# Altium footprint library UP-ROBOT Connectors(2013-02-26).PcbLib: 121 footprints (part 2 of 8)
Each footprint in its own frame and in the unit in brackets; x right, y up, seen from the top. Pads: shape width x height; smd on the part's side, far side on the other; paste and mask are expansions set on the pad; w line width, h text height; cw(c..) or ccw(c..) is an arc to the next point about the centre after c.
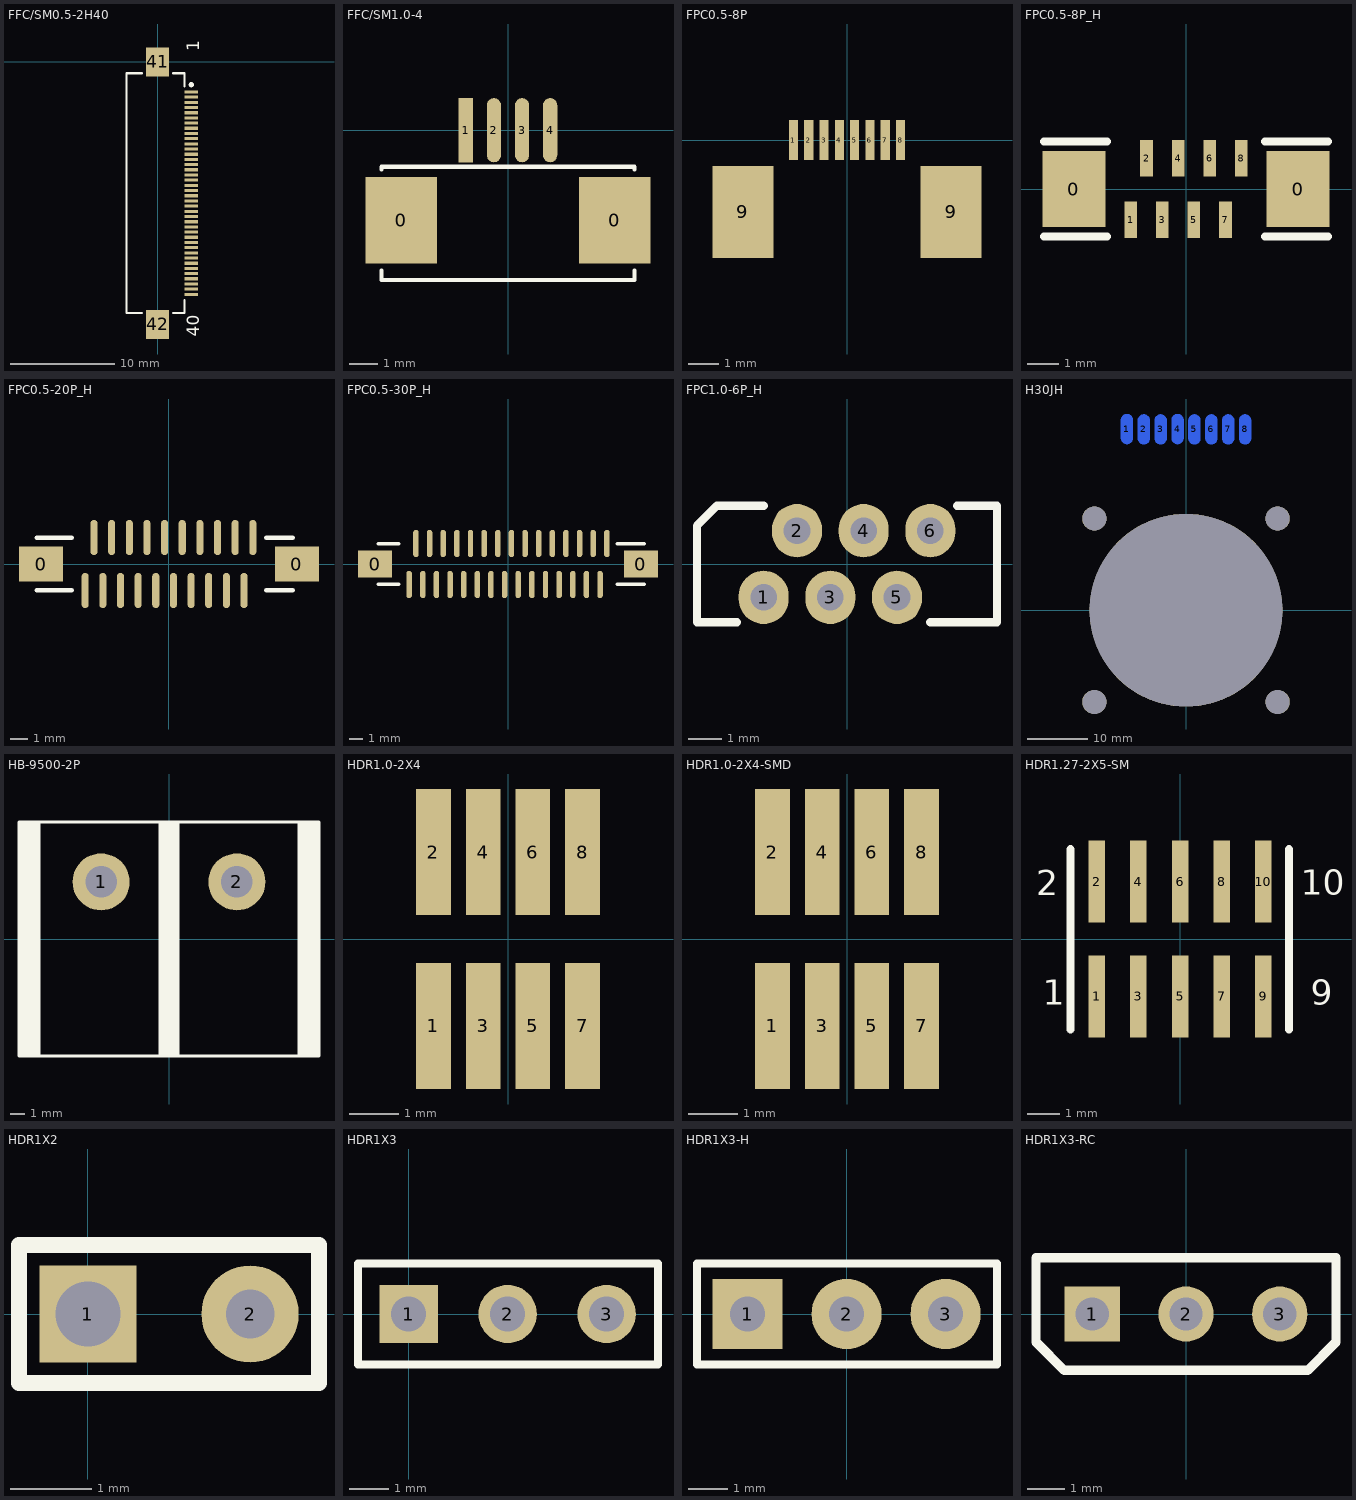
[diagram p1: the footprints below, top view; thin cyan lines are the x and y axes]

## FFC/SM0.5-2H40 [mm]
pads (42):
  rect 1.3x0.3 smd: 1(3.25,-2.9) 2(3.25,-3.4) 3(3.25,-3.9) 4(3.25,-4.4) 5(3.25,-4.9) 6(3.25,-5.4) 7(3.25,-5.9) 8(3.25,-6.4) 9(3.25,-6.9) 10(3.25,-7.4) 11(3.25,-7.9) 12(3.25,-8.4) 13(3.25,-8.9) 14(3.25,-9.4) 15(3.25,-9.9) 16(3.25,-10.4) 17(3.25,-10.9) 18(3.25,-11.4) 19(3.25,-11.9) 20(3.25,-12.4) 21(3.25,-12.9) 22(3.25,-13.4) 23(3.25,-13.9) 24(3.25,-14.4) 25(3.25,-14.9) 26(3.25,-15.4) 27(3.25,-15.9) 28(3.25,-16.4) 29(3.25,-16.9) 30(3.25,-17.4) 31(3.25,-17.9) 32(3.25,-18.4) 33(3.25,-18.9) 34(3.25,-19.4) 35(3.25,-19.9) 36(3.25,-20.4) 37(3.25,-20.9) 38(3.25,-21.4) 39(3.25,-21.9) 40(3.25,-22.4)
  rect 2.2x2.8 smd: 41(0,0) 42(0,-25.3)
Top Overlay:
  circle w0.25: c3.25,-2.2 r0.125
  lines w0.2: -1.5,-24.2 -3,-24.2 -3,-1.1 -1.5,-1.1 ; 1.5,-24.2 2.6,-24.2 2.6,-22.95 ; 1.5,-1.1 2.6,-1.1 2.6,-2.35
  text "1" at 4,1 h1.2
  text "40" at 4,-26.5 h1.2

## FFC/SM1.0-4 [mm]
pads (6):
  rect 2.54x3.08 smd: 0(-3.8,-3.2) 0(3.8,-3.2)
  rect 0.508x2.286 smd: 1(-1.5,0)
  oval 0.508x2.286 smd: 2(-0.5,0) 3(0.5,0) 4(1.5,0)
Top Overlay:
  lines w0.15: -4.5,-5.33 4.5,-5.33 ; -4.5,-5.3 -4.5,-5 ; -4.5,-1.4 -4.5,-1.3 0.054,-1.3 4.5,-1.3 4.5,-1.4 ; 4.5,-5.3 4.5,-5

## FPC0.5-8P [mm]
pads (10):
  rect 0.3x1.3 smd: 1(-1.75,0) 2(-1.25,0) 3(-0.75,0) 4(-0.25,0) 5(0.25,0) 6(0.75,0) 7(1.25,0) 8(1.75,0)
  rect 2x3 smd: 9(-3.4,-2.35) 9(3.4,-2.35)
3D body: height 1.2, standoff 0, extent -4.452,-3.905 4.448,-0.455

## FPC0.5-8P_H [mm]
pads (10):
  rect 2x2.4 smd: 0(-3.55,0) 0(3.55,0)
  rect 0.4x1.15 smd: 1(-1.75,-0.975) 2(-1.25,0.975) 3(-0.75,-0.975) 4(-0.25,0.975) 5(0.25,-0.975) 6(0.75,0.975) 7(1.25,-0.975) 8(1.75,0.975)
Top Overlay:
  lines w0.254: -4.5,-1.5 -2.5,-1.5 ; -4.5,1.5 -2.5,1.5 ; 2.5,-1.5 4.5,-1.5 ; 2.5,1.5 4.5,1.5
3D body: height 4.15, standoff 0, extent -4.25,-1.7 4.25,1.75

## FPC0.5-20P_H [mm]
pads (22):
  rect 2.5x2 smd: 0(-7.25,0) 0(7.25,0)
  oval 0.4x2 smd: 1(-4.75,-1.5) 2(-4.25,1.5) 3(-3.75,-1.5) 4(-3.25,1.5) 5(-2.75,-1.5) 6(-2.25,1.5) 7(-1.75,-1.5) 8(-1.25,1.5) 9(-0.75,-1.5) 10(-0.25,1.5) 11(0.25,-1.5) 12(0.75,1.5) 13(1.25,-1.5) 14(1.75,1.5) 15(2.25,-1.5) 16(2.75,1.5) 17(3.25,-1.5) 18(3.75,1.5) 19(4.25,-1.5) 20(4.75,1.5)
Top Overlay:
  lines w0.254: -7.5,-1.5 -5.5,-1.5 ; -7.5,1.5 -5.5,1.5 ; 5.5,-1.5 7,-1.5 ; 5.5,1.5 7,1.5
3D body: height 5.3, standoff 0, extent -7.86,-1.65 7.84,1.85

## FPC0.5-30P_H [mm]
pads (32):
  rect 2.5x2 smd: 0(-9.75,0) 0(9.75,0)
  oval 0.4x2 smd: 1(7.25,1.5) 2(6.75,-1.5) 3(6.25,1.5) 4(5.75,-1.5) 5(5.25,1.5) 6(4.75,-1.5) 7(4.25,1.5) 8(3.75,-1.5) 9(3.25,1.5) 10(2.75,-1.5) 11(2.25,1.5) 12(1.75,-1.5) 13(1.25,1.5) 14(0.75,-1.5) 15(0.25,1.5) 16(-0.25,-1.5) 17(-0.75,1.5) 18(-1.25,-1.5) 19(-1.75,1.5) 20(-2.25,-1.5) 21(-2.75,1.5) 22(-3.25,-1.5) 23(-3.75,1.5) 24(-4.25,-1.5) 25(-4.75,1.5) 26(-5.25,-1.5) 27(-5.75,1.5) 28(-6.25,-1.5) 29(-6.75,1.5) 30(-7.25,-1.5)
Top Overlay:
  lines w0.254: -9.5,-1.5 -8,-1.5 ; -9.5,1.5 -8,1.5 ; 8,-1.5 10,-1.5 ; 8,1.5 10,1.5

## FPC1.0-6P_H [mm]
pads (6):
  oval 1.5x1.6 hole 0.8: 1(-2.5,-1) 2(-1.5,1) 3(-0.5,-1) 4(0.5,1) 5(1.5,-1) 6(2.5,1)
Top Overlay:
  lines w0.254: -3.3,-1.75 -4.5,-1.75 -4.5,1.15 -3.9,1.75 -2.5,1.75 ; 2.5,-1.75 4.5,-1.75 4.5,1.75 3.3,1.75

## H30JH [mm]
pads (13):
  oval 2x5 smd far side: 1(-9.8,30.05) 2(-7,30) 3(-4.2,30) 4(-1.4,30.05) 5(1.4,30) 6(4.2,30) 7(7,30) 8(9.8,30)
  round 4 hole 4: ""(-15.205,-15.205) ""(-15.205,15.205) ""(15.205,-15.205) ""(15.205,15.205)
  round 32 hole 32: ""(0,0)
3D body: height 18, standoff -34, extent -26,-25.987 25.993,26.007

## HB-9500-2P [mm]
pads (2):
  round 4 hole 2.2: 1(-4.75,4) 2(4.75,4)
Top Overlay:
  rectangle: -0.75,-8.2 0.75,8.2
  rectangle: 9,-8.2 10.5,8.2
  region: -9,8.2 -10.5,8.2 -10.5,-8.2 -9,-8.2
  lines w0.2: -10.5,-8.2 10.5,-8.2 10.5,8.2 -10.5,8.2 -10.5,-8.2
3D body: height 3.5, standoff -17, extent -10.3,-8 10.3,8

## HDR1.0-2X4 [mm]
pads (8):
  rect 0.7x2.54 smd: 1(-1.5,-1.75) 2(-1.5,1.75) 3(-0.5,-1.75) 4(-0.5,1.75) 5(0.5,-1.75) 6(0.5,1.75) 7(1.5,-1.75) 8(1.5,1.75)
3D body: height 3.7, standoff -0.01, extent -1.99,-2.56 2.01,2.64

## HDR1.0-2X4-SMD [mm]
pads (8):
  rect 0.7x2.54 smd: 1(-1.5,-1.75) 2(-1.5,1.75) 3(-0.5,-1.75) 4(-0.5,1.75) 5(0.5,-1.75) 6(0.5,1.75) 7(1.5,-1.75) 8(1.5,1.75)
3D body: height 3.7, standoff -0.01, extent -1.99,-2.56 2.01,2.64

## HDR1.27-2X5-SM [mm]
pads (10):
  rect 0.5x2.5 smd: 1(-2.54,-1.75) 2(-2.54,1.75) 3(-1.27,-1.75) 4(-1.27,1.75) 5(0,-1.75) 6(0,1.75) 7(1.27,-1.75) 8(1.27,1.75) 9(2.54,-1.75) 10(2.54,1.75)
Top Overlay:
  lines w0.254: -3.34,-2.76 -3.34,2.74 ; 3.32,-2.76 3.32,2.74
  text "1" at -4.19,-2.01 h0.76
  text "2" at -4.39,1.33 h0.76
  text "9" at 3.99,-2.01 h0.76
  text "10" at 3.68,1.35 h0.76
3D body: height 4.5, standoff 0, extent -3.185,-2.76 3.165,2.74

## HDR1X2 [mm]
pads (2):
  rect 1.2x1.2 hole 0.8: 1(0,0)
  round 1.2 hole 0.6: 2(2,0)
Top Overlay:
  lines w0.2: 2.85,0.84 2.85,-0.85 -0.85,-0.85 -0.85,0.85 2.85,0.85

## HDR1X3 [mm]
pads (3):
  rect 1.5x1.5 hole 0.9: 1(0,0)
  round 1.5 hole 0.9: 2(2.54,0) 3(5.08,0)
Top Overlay:
  lines w0.203: -1.3,-1.3 6.4,-1.3 6.4,1.3 -1.3,1.3 -1.3,-1.3
3D body: height 9.04, standoff -3, extent -1.28,-1.2 6.34,1.34

## HDR1X3-H [mm]
pads (3):
  rect 1.8x1.8 hole 0.9: 1(-2.54,0)
  round 1.8 hole 0.9: 2(0,0) 3(2.54,0)
Top Overlay:
  lines w0.203: -3.84,-1.3 3.86,-1.3 3.86,1.3 -3.84,1.3 -3.84,-1.3
3D body: height 1.2, standoff -6.6, extent -3.81,-6.75 3.81,1.27

## HDR1X3-RC [mm]
pads (3):
  rect 1.5x1.5 hole 0.9: 1(-2.54,0)
  round 1.5 hole 0.9: 2(0,0) 3(2.54,0)
Top Overlay:
  lines w0.254: -4.064,-0.762 -4.064,1.524 4.064,1.524 4.064,-0.762 3.302,-1.524 0,-1.524 -3.302,-1.524 -4.064,-0.762
3D body: height 9.04, standoff -3, extent -3.82,-1.2 3.8,1.34